# Altium footprint library PcbLib1.PcbLib: 1009 footprints (part 4 of 64)
Each footprint in its own frame and in the unit in brackets; x right, y up, seen from the top. Pads: shape width x height; smd on the part's side, far side on the other; paste and mask are expansions set on the pad; w line width, h text height; cw(c..) or ccw(c..) is an arc to the next point about the centre after c.
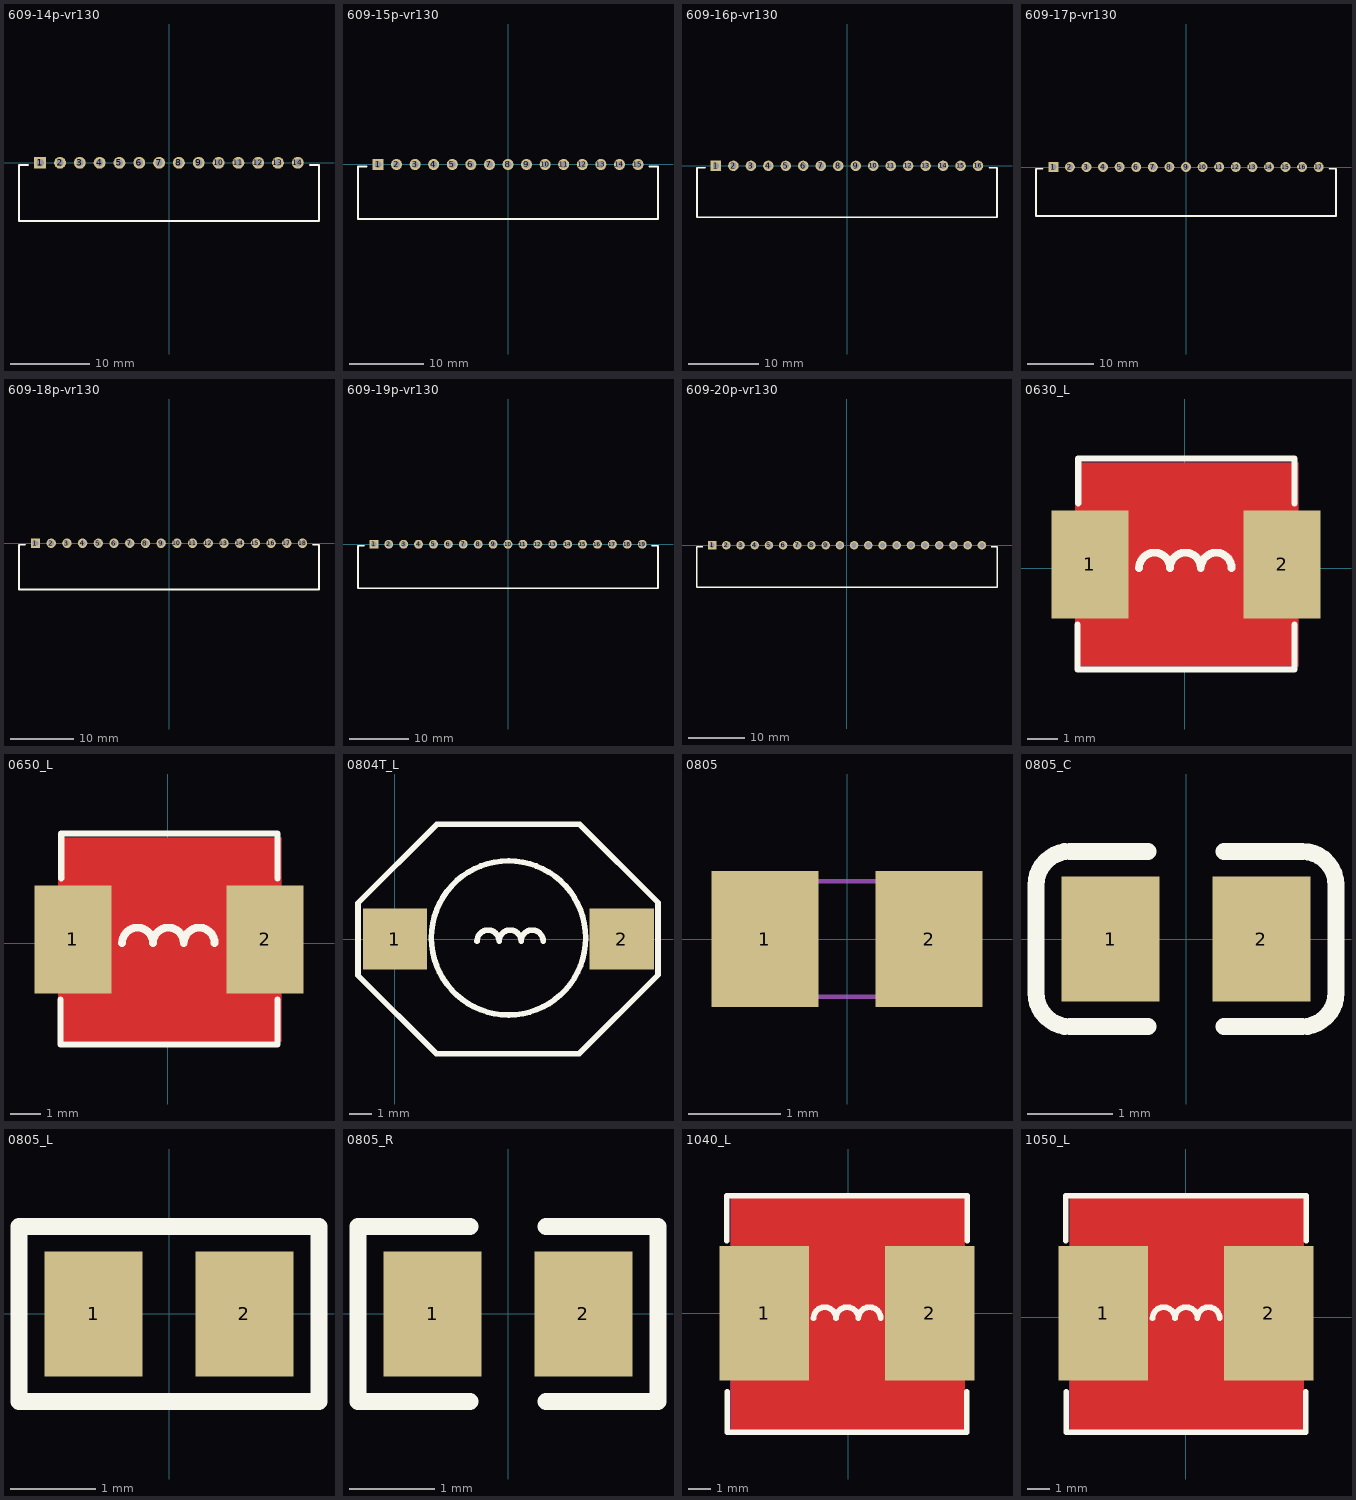
[diagram p3: the footprints below, top view; thin cyan lines are the x and y axes]

## 609-14p-vr130 [mm]
height 11.7
pads (14):
  rect 1.5x1.5 hole 0.9: 1(-16.25,0)
  round 1.5 hole 0.9: 2(-13.75,0) 3(-11.25,0) 4(-8.75,0) 5(-6.25,0) 6(-3.75,0) 7(-1.25,0) 8(1.25,0) 9(3.75,0) 10(6.25,0) 11(8.75,0) 12(11.25,0) 13(13.75,0) 14(16.25,0)
Top Overlay:
  lines w0.254: -17.76,-0.254 -18.923,-0.254 -18.923,-7.366 18.923,-7.366 18.923,-0.254 17.8,-0.254
3D body "v150-090.stp": height 0.02, standoff -1.65, extent -2,-0.75 -0.5,0.75
3D body "v150-090.stp": height 0.02, standoff -1.65, extent -7,-0.75 -5.5,0.75
3D body "v150-090.stp": height 0.02, standoff -1.65, extent -12,-0.75 -10.5,0.75
3D body "vf150-090.stp": height 0.01, standoff -1.65, extent -17,-0.75 -15.5,0.75
3D body "v150-090.stp": height 0.02, standoff -1.65, extent -14.5,-0.75 -13,0.75
3D body "v150-090.stp": height 0.02, standoff -1.65, extent -9.507,-0.75 -8.007,0.75
3D body "v150-090.stp": height 0.02, standoff -1.65, extent -4.5,-0.75 -3,0.75
3D body "v150-090.stp": height 0.02, standoff -1.65, extent 0.5,-0.75 2,0.75
3D body "v150-090.stp": height 0.02, standoff -1.65, extent 3,-0.75 4.5,0.75
3D body "v150-090.stp": height 0.02, standoff -1.65, extent 5.5,-0.75 7,0.75
3D body "v150-090.stp": height 0.02, standoff -1.65, extent 8,-0.75 9.5,0.75
3D body "v150-090.stp": height 0.02, standoff -1.65, extent 10.5,-0.75 12,0.75
3D body "v150-090.stp": height 0.02, standoff -1.65, extent 13,-0.75 14.5,0.75
3D body "v150-090.stp": height 0.02, standoff -1.65, extent 15.5,-0.75 17,0.75
3D body "609-14p-vr130.stp": height 5.75, standoff -3.35, extent -18.75,-7.254 18.75,0.386

## 609-15p-vr130 [mm]
height 11.7
pads (15):
  rect 1.5x1.5 hole 0.9: 1(-17.5,0)
  round 1.5 hole 0.9: 2(-15,0) 3(-12.5,0) 4(-10,0) 5(-7.5,0) 6(-5,0) 7(-2.5,0) 8(0,0) 9(2.5,0) 10(5,0) 11(7.5,0) 12(10,0) 13(12.5,0) 14(15,0) 15(17.5,0)
Top Overlay:
  lines w0.254: -19.05,-0.254 -20.193,-0.254 -20.193,-7.366 20.193,-7.366 20.193,-0.254 19.05,-0.254
3D body "v150-090.stp": height 0.02, standoff -1.65, extent -3.25,-0.75 -1.75,0.75
3D body "v150-090.stp": height 0.02, standoff -1.65, extent -8.25,-0.75 -6.75,0.75
3D body "v150-090.stp": height 0.02, standoff -1.65, extent -13.25,-0.75 -11.75,0.75
3D body "vf150-090.stp": height 0.01, standoff -1.65, extent -18.25,-0.75 -16.75,0.75
3D body "v150-090.stp": height 0.02, standoff -1.65, extent -15.75,-0.75 -14.25,0.75
3D body "v150-090.stp": height 0.02, standoff -1.65, extent -10.757,-0.75 -9.257,0.75
3D body "v150-090.stp": height 0.02, standoff -1.65, extent -5.75,-0.75 -4.25,0.75
3D body "v150-090.stp": height 0.02, standoff -1.65, extent -0.75,-0.75 0.75,0.75
3D body "v150-090.stp": height 0.02, standoff -1.65, extent 1.75,-0.75 3.25,0.75
3D body "v150-090.stp": height 0.02, standoff -1.65, extent 4.25,-0.75 5.75,0.75
3D body "v150-090.stp": height 0.02, standoff -1.65, extent 6.75,-0.75 8.25,0.75
3D body "v150-090.stp": height 0.02, standoff -1.65, extent 9.25,-0.75 10.75,0.75
3D body "v150-090.stp": height 0.02, standoff -1.65, extent 11.75,-0.75 13.25,0.75
3D body "v150-090.stp": height 0.02, standoff -1.65, extent 14.25,-0.75 15.75,0.75
3D body "v150-090.stp": height 0.02, standoff -1.65, extent 16.75,-0.75 18.25,0.75
3D body "609-15p-vr130.stp": height 5.75, standoff -3.35, extent -20,-7.254 20,0.386

## 609-16p-vr130 [mm]
height 11.7
pads (16):
  rect 1.5x1.5 hole 0.9: 1(-18.75,0)
  round 1.5 hole 0.9: 2(-16.25,0) 3(-13.75,0) 4(-11.25,0) 5(-8.75,0) 6(-6.25,0) 7(-3.75,0) 8(-1.25,0) 9(1.25,0) 10(3.75,0) 11(6.25,0) 12(8.75,0) 13(11.25,0) 14(13.75,0) 15(16.25,0) 16(18.75,0)
Top Overlay:
  lines w0.254: -20.3,-0.254 -21.463,-0.254 -21.463,-7.366 21.463,-7.366 21.463,-0.254 20.34,-0.254
3D body "v150-090.stp": height 0.02, standoff -1.65, extent -4.5,-0.75 -3,0.75
3D body "v150-090.stp": height 0.02, standoff -1.65, extent -9.5,-0.75 -8,0.75
3D body "v150-090.stp": height 0.02, standoff -1.65, extent -14.5,-0.75 -13,0.75
3D body "vf150-090.stp": height 0.01, standoff -1.65, extent -19.5,-0.75 -18,0.75
3D body "v150-090.stp": height 0.02, standoff -1.65, extent -17,-0.75 -15.5,0.75
3D body "v150-090.stp": height 0.02, standoff -1.65, extent -12.007,-0.75 -10.507,0.75
3D body "v150-090.stp": height 0.02, standoff -1.65, extent -7,-0.75 -5.5,0.75
3D body "v150-090.stp": height 0.02, standoff -1.65, extent -2,-0.75 -0.5,0.75
3D body "v150-090.stp": height 0.02, standoff -1.65, extent 0.5,-0.75 2,0.75
3D body "v150-090.stp": height 0.02, standoff -1.65, extent 3,-0.75 4.5,0.75
3D body "v150-090.stp": height 0.02, standoff -1.65, extent 5.5,-0.75 7,0.75
3D body "v150-090.stp": height 0.02, standoff -1.65, extent 8,-0.75 9.5,0.75
3D body "v150-090.stp": height 0.02, standoff -1.65, extent 10.5,-0.75 12,0.75
3D body "v150-090.stp": height 0.02, standoff -1.65, extent 13,-0.75 14.5,0.75
3D body "v150-090.stp": height 0.02, standoff -1.65, extent 15.5,-0.75 17,0.75
3D body "v150-090.stp": height 0.02, standoff -1.65, extent 18,-0.75 19.5,0.75
3D body "609-16p-vr130.stp": height 5.75, standoff -3.35, extent -21.25,-7.254 21.25,0.386

## 609-17p-vr130 [mm]
height 11.7
pads (17):
  rect 1.5x1.5 hole 0.9: 1(-20,0)
  round 1.5 hole 0.9: 2(-17.5,0) 3(-15,0) 4(-12.5,0) 5(-10,0) 6(-7.5,0) 7(-5,0) 8(-2.5,0) 9(0,0) 10(2.5,0) 11(5,0) 12(7.5,0) 13(10,0) 14(12.5,0) 15(15,0) 16(17.5,0) 17(20,0)
Top Overlay:
  lines w0.254: -21.59,-0.254 -22.606,-0.254 -22.606,-7.366 22.606,-7.366 22.606,-0.254 21.59,-0.254
3D body "609-17p-vr130.stp": height 5.75, standoff -3.35, extent -22.5,-7.254 22.5,0.386
3D body "v150-090.stp": height 0.02, standoff -1.65, extent -5.75,-0.75 -4.25,0.75
3D body "v150-090.stp": height 0.02, standoff -1.65, extent -10.75,-0.75 -9.25,0.75
3D body "v150-090.stp": height 0.02, standoff -1.65, extent -15.75,-0.75 -14.25,0.75
3D body "vf150-090.stp": height 0.01, standoff -1.65, extent -20.75,-0.75 -19.25,0.75
3D body "v150-090.stp": height 0.02, standoff -1.65, extent -18.25,-0.75 -16.75,0.75
3D body "v150-090.stp": height 0.02, standoff -1.65, extent -13.257,-0.75 -11.757,0.75
3D body "v150-090.stp": height 0.02, standoff -1.65, extent -8.25,-0.75 -6.75,0.75
3D body "v150-090.stp": height 0.02, standoff -1.65, extent -3.25,-0.75 -1.75,0.75
3D body "v150-090.stp": height 0.02, standoff -1.65, extent -0.75,-0.75 0.75,0.75
3D body "v150-090.stp": height 0.02, standoff -1.65, extent 1.75,-0.75 3.25,0.75
3D body "v150-090.stp": height 0.02, standoff -1.65, extent 4.25,-0.75 5.75,0.75
3D body "v150-090.stp": height 0.02, standoff -1.65, extent 6.75,-0.75 8.25,0.75
3D body "v150-090.stp": height 0.02, standoff -1.65, extent 9.25,-0.75 10.75,0.75
3D body "v150-090.stp": height 0.02, standoff -1.65, extent 11.75,-0.75 13.25,0.75
3D body "v150-090.stp": height 0.02, standoff -1.65, extent 14.25,-0.75 15.75,0.75
3D body "v150-090.stp": height 0.02, standoff -1.65, extent 16.75,-0.75 18.25,0.75
3D body "v150-090.stp": height 0.02, standoff -1.65, extent 19.25,-0.75 20.75,0.75

## 609-18p-vr130 [mm]
height 11.7
pads (18):
  rect 1.5x1.5 hole 0.9: 1(-21.25,0)
  round 1.5 hole 0.9: 2(-18.75,0) 3(-16.25,0) 4(-13.75,0) 5(-11.25,0) 6(-8.75,0) 7(-6.25,0) 8(-3.75,0) 9(-1.25,0) 10(1.25,0) 11(3.75,0) 12(6.25,0) 13(8.75,0) 14(11.25,0) 15(13.75,0) 16(16.25,0) 17(18.75,0) 18(21.25,0)
Top Overlay:
  lines w0.254: -22.86,-0.254 -23.876,-0.254 -23.876,-7.366 23.876,-7.366 23.876,-0.254 22.86,-0.254
3D body "v150-090.stp": height 0.02, standoff -1.65, extent 18,-0.75 19.5,0.75
3D body "v150-090.stp": height 0.02, standoff -1.65, extent 15.5,-0.75 17,0.75
3D body "v150-090.stp": height 0.02, standoff -1.65, extent 13,-0.75 14.5,0.75
3D body "v150-090.stp": height 0.02, standoff -1.65, extent 10.5,-0.75 12,0.75
3D body "v150-090.stp": height 0.02, standoff -1.65, extent 8,-0.75 9.5,0.75
3D body "v150-090.stp": height 0.02, standoff -1.65, extent 5.5,-0.75 7,0.75
3D body "v150-090.stp": height 0.02, standoff -1.65, extent 3,-0.75 4.5,0.75
3D body "v150-090.stp": height 0.02, standoff -1.65, extent 0.5,-0.75 2,0.75
3D body "v150-090.stp": height 0.02, standoff -1.65, extent -2,-0.75 -0.5,0.75
3D body "v150-090.stp": height 0.02, standoff -1.65, extent -4.5,-0.75 -3,0.75
3D body "v150-090.stp": height 0.02, standoff -1.65, extent -9.5,-0.75 -8,0.75
3D body "v150-090.stp": height 0.02, standoff -1.65, extent -14.507,-0.75 -13.007,0.75
3D body "v150-090.stp": height 0.02, standoff -1.65, extent -19.5,-0.75 -18,0.75
3D body "vf150-090.stp": height 0.01, standoff -1.65, extent -22,-0.75 -20.5,0.75
3D body "v150-090.stp": height 0.02, standoff -1.65, extent -17,-0.75 -15.5,0.75
3D body "v150-090.stp": height 0.02, standoff -1.65, extent -12,-0.75 -10.5,0.75
3D body "v150-090.stp": height 0.02, standoff -1.65, extent -7,-0.75 -5.5,0.75
3D body "v150-090.stp": height 0.02, standoff -1.65, extent 20.5,-0.75 22,0.75
3D body "609-18p-vr130.stp": height 5.75, standoff -3.35, extent -23.75,-7.254 23.75,0.386

## 609-19p-vr130 [mm]
height 11.7
pads (19):
  rect 1.5x1.5 hole 0.9: 1(-22.5,0)
  round 1.5 hole 0.9: 2(-20,0) 3(-17.5,0) 4(-15,0) 5(-12.5,0) 6(-10,0) 7(-7.5,0) 8(-5,0) 9(-2.5,0) 10(0,0) 11(2.5,0) 12(5,0) 13(7.5,0) 14(10,0) 15(12.5,0) 16(15,0) 17(17.5,0) 18(20,0) 19(22.5,0)
Top Overlay:
  lines w0.254: -24.13,-0.254 -25.146,-0.254 -25.146,-7.366 25.146,-7.366 25.146,-0.254 24.13,-0.254
3D body "v150-090.stp": height 0.02, standoff -1.65, extent 16.75,-0.75 18.25,0.75
3D body "v150-090.stp": height 0.02, standoff -1.65, extent 14.25,-0.75 15.75,0.75
3D body "v150-090.stp": height 0.02, standoff -1.65, extent 11.75,-0.75 13.25,0.75
3D body "v150-090.stp": height 0.02, standoff -1.65, extent 9.25,-0.75 10.75,0.75
3D body "v150-090.stp": height 0.02, standoff -1.65, extent 6.75,-0.75 8.25,0.75
3D body "v150-090.stp": height 0.02, standoff -1.65, extent 4.25,-0.75 5.75,0.75
3D body "v150-090.stp": height 0.02, standoff -1.65, extent 1.75,-0.75 3.25,0.75
3D body "v150-090.stp": height 0.02, standoff -1.65, extent -0.75,-0.75 0.75,0.75
3D body "v150-090.stp": height 0.02, standoff -1.65, extent -3.25,-0.75 -1.75,0.75
3D body "v150-090.stp": height 0.02, standoff -1.65, extent -5.75,-0.75 -4.25,0.75
3D body "v150-090.stp": height 0.02, standoff -1.65, extent -10.75,-0.75 -9.25,0.75
3D body "v150-090.stp": height 0.02, standoff -1.65, extent -15.757,-0.75 -14.257,0.75
3D body "v150-090.stp": height 0.02, standoff -1.65, extent -20.75,-0.75 -19.25,0.75
3D body "vf150-090.stp": height 0.01, standoff -1.65, extent -23.25,-0.75 -21.75,0.75
3D body "v150-090.stp": height 0.02, standoff -1.65, extent -18.25,-0.75 -16.75,0.75
3D body "v150-090.stp": height 0.02, standoff -1.65, extent -13.25,-0.75 -11.75,0.75
3D body "v150-090.stp": height 0.02, standoff -1.65, extent -8.25,-0.75 -6.75,0.75
3D body "v150-090.stp": height 0.02, standoff -1.65, extent 19.25,-0.75 20.75,0.75
3D body "v150-090.stp": height 0.02, standoff -1.65, extent 21.75,-0.75 23.25,0.75
3D body "609-19p-vr130.stp": height 5.75, standoff -3.35, extent -25,-7.254 25,0.386

## 609-20p-vr130 [mm]
height 11.7
pads (20):
  rect 1.5x1.5 hole 0.9: 1(-23.75,0)
  round 1.5 hole 0.9: 2(-21.25,0) 3(-18.75,0) 4(-16.25,0) 5(-13.75,0) 6(-11.25,0) 7(-8.75,0) 8(-6.25,0) 9(-3.75,0) 10(-1.25,0) 11(1.25,0) 12(3.75,0) 13(6.25,0) 14(8.75,0) 15(11.25,0) 16(13.75,0) 17(16.25,0) 18(18.75,0) 19(21.25,0) 20(23.75,0)
Top Overlay:
  lines w0.254: -25.4,-0.254 -26.416,-0.254 -26.416,-7.366 26.416,-7.366 26.416,-0.254 25.4,-0.254
3D body "609-20p-vr130.stp": height 5.75, standoff -3.35, extent -26.25,-7.254 26.25,0.386
3D body "v150-090.stp": height 0.02, standoff -1.65, extent 23.019,-0.75 24.519,0.75
3D body "v150-090.stp": height 0.02, standoff -1.65, extent 20.5,-0.75 22,0.75
3D body "v150-090.stp": height 0.02, standoff -1.65, extent 18,-0.75 19.5,0.75
3D body "v150-090.stp": height 0.02, standoff -1.65, extent -9.5,-0.75 -8,0.75
3D body "v150-090.stp": height 0.02, standoff -1.65, extent -14.5,-0.75 -13,0.75
3D body "v150-090.stp": height 0.02, standoff -1.65, extent -19.5,-0.75 -18,0.75
3D body "vf150-090.stp": height 0.01, standoff -1.65, extent -24.5,-0.75 -23,0.75
3D body "v150-090.stp": height 0.02, standoff -1.65, extent -22,-0.75 -20.5,0.75
3D body "v150-090.stp": height 0.02, standoff -1.65, extent -17.007,-0.75 -15.507,0.75
3D body "v150-090.stp": height 0.02, standoff -1.65, extent -12,-0.75 -10.5,0.75
3D body "v150-090.stp": height 0.02, standoff -1.65, extent -7,-0.75 -5.5,0.75
3D body "v150-090.stp": height 0.02, standoff -1.65, extent -4.5,-0.75 -3,0.75
3D body "v150-090.stp": height 0.02, standoff -1.65, extent -2,-0.75 -0.5,0.75
3D body "v150-090.stp": height 0.02, standoff -1.65, extent 0.5,-0.75 2,0.75
3D body "v150-090.stp": height 0.02, standoff -1.65, extent 3,-0.75 4.5,0.75
3D body "v150-090.stp": height 0.02, standoff -1.65, extent 5.5,-0.75 7,0.75
3D body "v150-090.stp": height 0.02, standoff -1.65, extent 8,-0.75 9.5,0.75
3D body "v150-090.stp": height 0.02, standoff -1.65, extent 10.5,-0.75 12,0.75
3D body "v150-090.stp": height 0.02, standoff -1.65, extent 13,-0.75 14.5,0.75
3D body "v150-090.stp": height 0.02, standoff -1.65, extent 15.5,-0.75 17,0.75

## 0630_L [mm]
pads (2):
  rect 2.5x3.5 smd: 1(-3.073,0.127) 2(3.15,0.127)
Top Layer:
  pour cut-out: -3.556,3.429 3.683,3.429 3.683,-3.175 -3.556,-3.175
Bottom Layer:
  pour cut-out: -3.556,3.429 3.683,3.429 3.683,-3.175 -3.556,-3.175
Top Overlay:
  lines w0.2: -3.48,-3.277 3.556,-3.277 ; -3.454,3.556 3.556,3.556
  lines w0.203: -3.48,-3.277 -3.48,-1.833 ; -3.454,2.108 -3.454,3.556 ; 3.556,-3.277 3.556,-1.833 ; 3.556,2.108 3.556,3.556
  lines w0.254: -1.482,0.007 cw(c-0.982,0.007) -0.482,0.007 cw(c0.018,0.007) 0.518,0.007 cw(c1.018,0.007) 1.518,0.007
3D body "INDM_VISHAY_IHLP2525CZ.stp": height 3, standoff 0, extent -3.569,-3.182 3.671,3.538

## 0650_L [mm]
pads (2):
  rect 2.5x3.5 smd: 1(-3.073,0.127) 2(3.15,0.127)
Top Layer:
  pour cut-out: -3.556,3.429 3.683,3.429 3.683,-3.175 -3.556,-3.175
Bottom Layer:
  pour cut-out: -3.556,3.429 3.683,3.429 3.683,-3.175 -3.556,-3.175
Top Overlay:
  lines w0.2: -3.48,-3.277 3.556,-3.277 ; -3.454,3.556 3.556,3.556
  lines w0.203: -3.48,-3.277 -3.48,-1.833 ; -3.454,2.108 -3.454,3.556 ; 3.556,-3.277 3.556,-1.833 ; 3.556,2.108 3.556,3.556
  lines w0.254: -1.482,0.007 cw(c-0.982,0.007) -0.482,0.007 cw(c0.018,0.007) 0.518,0.007 cw(c1.018,0.007) 1.518,0.007

## 0804T_L [mm] "功率电感"
pads (2):
  rect 2.92x2.79 smd: 1(0,0) 2(10.29,0)
Top Overlay:
  circle w0.254: c5.156,0.051 r3.5
  lines w0.254: 3.725,-0.094 cw(c4.225,-0.094) 4.725,-0.094 cw(c5.225,-0.094) 5.725,-0.094 cw(c6.225,-0.094) 6.725,-0.094 ; -1.676,-1.651 -1.676,1.626 1.905,5.207 8.357,5.207 8.382,5.207 11.938,1.651 11.938,-1.626 8.357,-5.207 8.331,-5.207 1.88,-5.207 -1.676,-1.651
Mechanical 13:
  lines w0.05: -1.025,-0.625 0.975,-0.625 ; -1,-0.625 -1,0.625 1,0.625 1,-0.625 -1,-0.625

## 0805 [mm]
pads (2):
  rect 1.16x1.47 smd: 1(-0.89,0) 2(0.89,0)
Mechanical 13:
  lines w0.05: -1,-0.625 1,-0.625 1,0.625 -1,0.625 -1,-0.625

## 0805_C [mm]
pads (2):
  rect 1.16x1.47 smd: 1(-0.89,0) 2(0.89,0)
Top Overlay:
  lines w0.2: -0.45,-1.035 -1.37,-1.035 cw(c-1.37,-0.635) -1.77,-0.635 -1.77,0.635 cw(c-1.37,0.635) -1.37,1.035 -0.45,1.035 ; 0.45,-1.035 1.37,-1.035 ccw(c1.37,-0.635) 1.77,-0.635 1.77,0.635 ccw(c1.37,0.635) 1.37,1.035 0.45,1.035
3D body "User Library-0805 SMD Capacitor.STEP": height 0.77, standoff -0.01, extent -0.999,-0.625 1.001,0.625

## 0805_L [mm]
pads (2):
  rect 1.16x1.47 smd: 1(-0.89,0) 2(0.89,0)
Top Overlay:
  lines w0.2: -1.77,-1.035 1.77,-1.035 1.77,1.035 -1.77,1.035 -1.77,-1.035
3D body "L0805.STEP": height 0.6, standoff -0.02, extent -1.022,-0.637 1.028,0.638

## 0805_R [mm]
pads (2):
  rect 1.16x1.47 smd: 1(-0.89,0) 2(0.89,0)
Top Overlay:
  lines w0.2: -0.45,-1.035 -1.77,-1.035 -1.77,1.035 -0.45,1.035 ; 0.45,-1.035 1.77,-1.035 1.77,1.035 0.45,1.035
3D body "User Library-R_0805.STEP": height 0.49, standoff -0.01, extent -0.997,-0.625 1.003,0.625

## 1040_L [mm]
height 7
pads (2):
  rect 4x6 smd: 1(-3.759,0) 2(3.632,0)
Top Layer:
  pour cut-out: -5.258,5.232 5.182,5.232 5.182,-5.232 -5.258,-5.232
Bottom Layer:
  pour cut-out: -5.247,5.131 5.182,5.131 5.182,-5.182 -5.268,-5.182
Top Overlay:
  lines w0.254: -5.436,3.25 -5.436,5.258 5.309,5.258 5.309,3.25 ; -5.41,-3.5 -5.41,-5.309 5.283,-5.309 5.283,-3.5 ; -1.558,-0.221 cw(c-1.058,-0.221) -0.558,-0.221 cw(c-0.058,-0.221) 0.442,-0.221 cw(c0.942,-0.221) 1.442,-0.221
3D body "IND_EPCOS_B82464-G4.stp": height 4.9, standoff 0, extent -5.225,-5.218 5.175,5.182

## 1050_L [mm]
height 7
pads (2):
  rect 4x6 smd: 1(-3.683,0.178) 2(3.708,0.178)
Top Layer:
  pour cut-out: -5.182,5.41 5.258,5.41 5.258,-5.055 -5.182,-5.055
Bottom Layer:
  pour cut-out: -5.17,5.309 5.258,5.309 5.258,-5.004 -5.192,-5.004
Top Overlay:
  lines w0.254: -5.359,3.428 -5.359,5.436 5.385,5.436 5.385,3.428 ; -5.334,-3.322 -5.334,-5.131 5.359,-5.131 5.359,-3.322 ; -1.482,-0.044 cw(c-0.982,-0.044) -0.482,-0.044 cw(c0.018,-0.044) 0.518,-0.044 cw(c1.018,-0.044) 1.518,-0.044
3D body "IND_EPCOS_B82464-G4.stp": height 4.9, standoff 0, extent -5.149,-5.041 5.251,5.359